# Altium footprint library THU VIEN PCB.PCBLib: 534 footprints (part 18 of 34)
Each footprint in its own frame and in the unit in brackets; x right, y up, seen from the top. Pads: shape width x height; smd on the part's side, far side on the other; paste and mask are expansions set on the pad; w line width, h text height; cw(c..) or ccw(c..) is an arc to the next point about the centre after c.
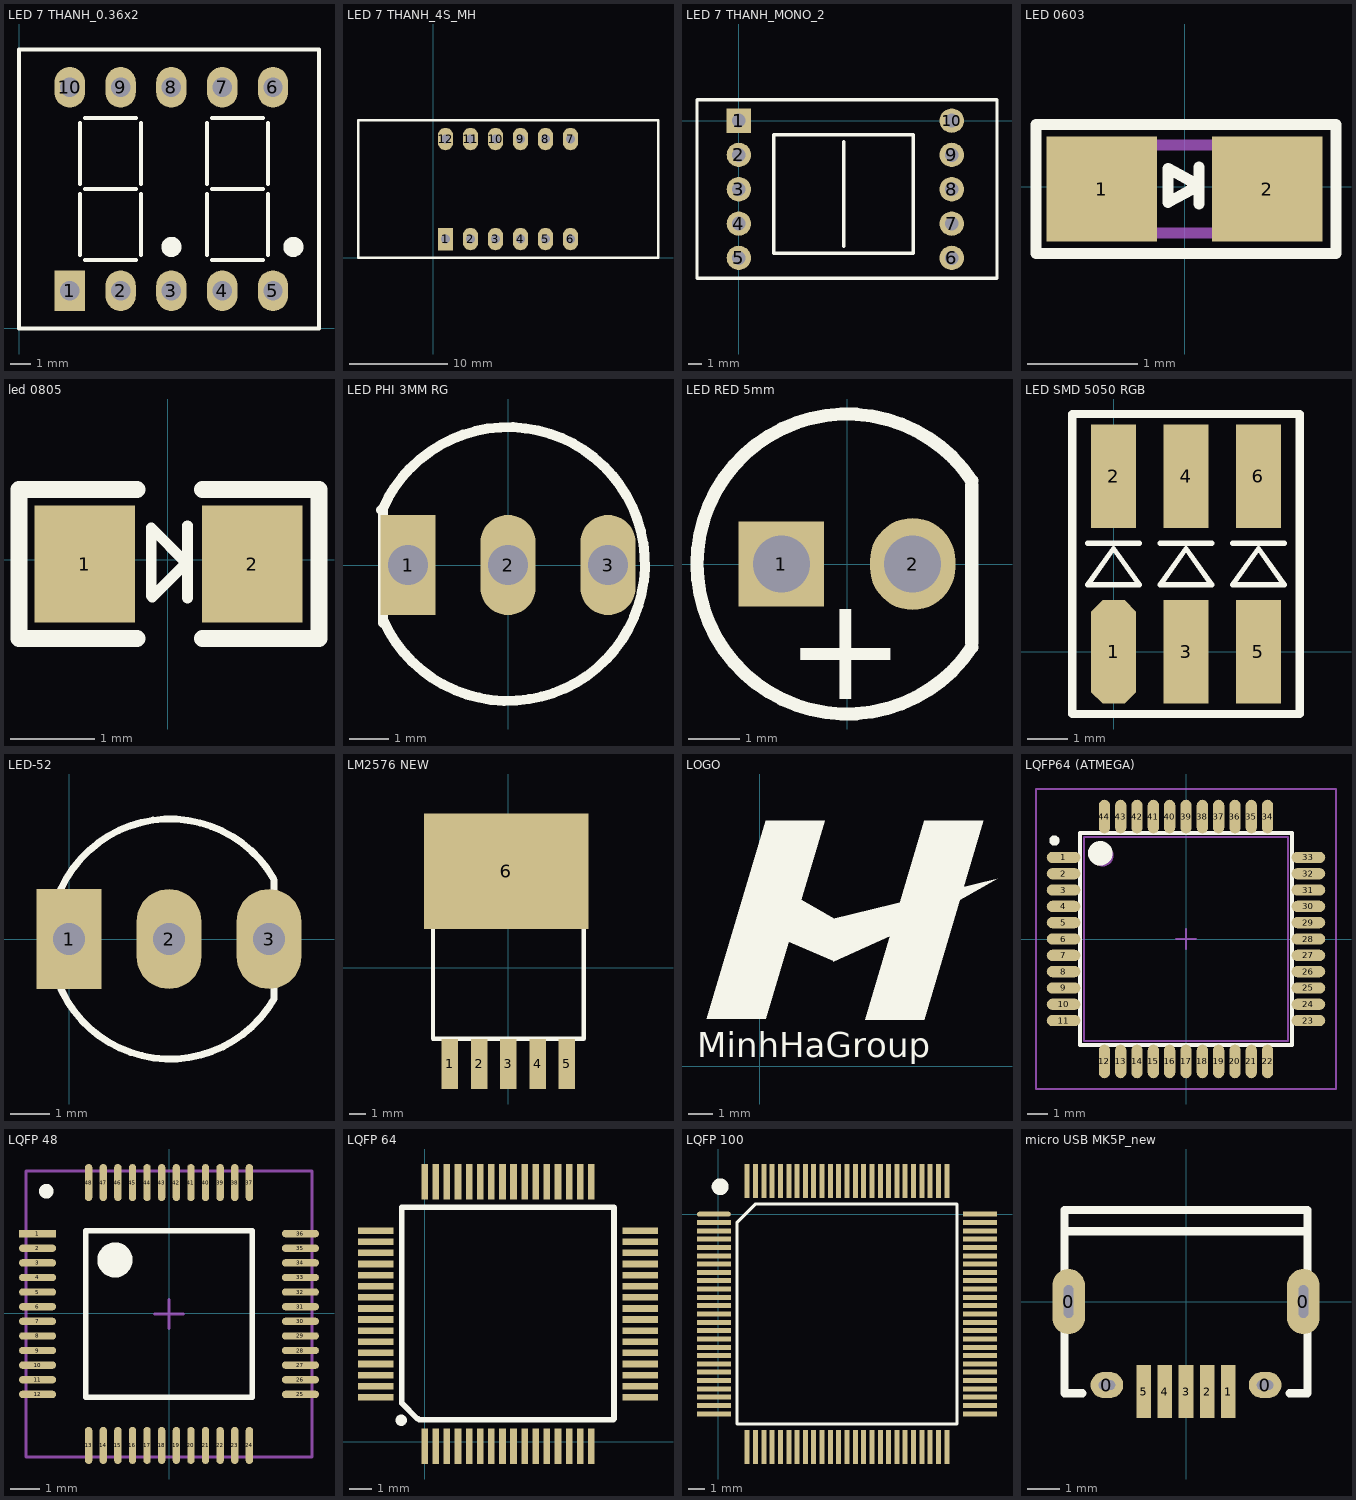
[diagram p17: the footprints below, top view; thin cyan lines are the x and y axes]

## LED 7 THANH_0.36x2 [mil]
pads (10):
  rect 60x80 hole 38: 1(100,74)
  oval 60x80 hole 38: 2(200,74) 3(300,74) 4(400,74) 5(500,74) 6(500,474) 7(400,474) 8(300,474) 9(200,474) 10(100,474)
Top Overlay:
  circle w19.68: c540,160 r10
  circle w19.68: c300,160 r10
  lines w8: 120,144 120,264 ; 120,284 120,404 ; 130,134 230,134 ; 130,274 230,274 ; 130,414 230,414 ; 240,144 240,264 ; 240,284 240,404 ; 370,144 370,264 ; 370,284 370,404 ; 380,134 480,134 ; 380,274 480,274 ; 380,414 480,414 ; 490,144 490,264 ; 490,284 490,404 ; 0,-1 590.55,-1 590.55,549 0,549 0,-1

## LED 7 THANH_4S_MH [mil] "LED7seg4"
pads (12):
  rect 60x90 hole 35: 1(50,75)
  oval 60x90 hole 35: 2(150,75) 3(250,75) 4(350,75) 5(450,75) 6(550,75) 7(550,475) 8(450,475) 9(350,475) 10(250,475) 11(150,475) 12(50,475)
Top Overlay:
  lines w10: -300,0 -300,75 -300,550 -265,550 900,550 900,0 -300,0

## LED 7 THANH_MONO_2 [mm]
pads (10):
  rect 1.778x1.778 hole 1 unplated: 1(0,0)
  round 1.778 hole 1 unplated: 2(0,-2.5) 3(0,-5) 4(0,-7.5) 5(0,-10) 6(15.5,-10) 7(15.5,-7.5) 8(15.5,-5) 9(15.5,-2.5) 10(15.5,0)
Top Overlay:
  lines w0.2: -3.048,-11.484 -3.048,1.016 ; 18.796,-11.484 18.796,1.016
  lines w0.254: -3.048,-11.484 18.796,-11.484 ; -3.048,1.016 -3.048,1.524 18.796,1.524 18.796,1.016 ; 7.62,-9.144 7.62,-8.636 7.62,-1.524 ; 2.54,-9.652 2.54,-1.016 12.7,-1.016 12.7,-9.652 2.54,-9.652

## LED 0603 [mm]
pads (2):
  rect 1x0.95 smd mask+0.076: 1(-0.753,-0.019) 2(0.747,-0.019)
Top Overlay:
  lines w0.102: -0.152,-0.139 0.127,0.014 -0.152,0.166 ; -0.152,-0.127 -0.152,0.152 ; 0.127,-0.152 0.127,0.178 ; -1.349,-0.603 -1.349,0.565 1.369,0.565 1.369,-0.603 -1.349,-0.603
Mechanical 13:
  lines w0.1: -0.803,-0.419 -0.803,0.381 0.797,0.381 0.797,-0.419 -0.803,-0.419
3D body "User Library-LED_0603_B.STEP": height 0.6, standoff 0, extent -0.8,-0.4 0.8,0.4

## led 0805 [mm]
pads (2):
  rect 1.2x1.4 smd: 1(-0.996,-0.051) 2(1.004,-0.051)
Top Overlay:
  lines w0.127: -0.199,0.381 -0.199,-0.432 -0.186,-0.445 0.22,-0.038 -0.186,0.368 ; 0.233,-0.457 0.233,0.406
  lines w0.2: -0.367,-0.94 -1.778,-0.94 -1.778,0.838 -0.367,0.838 ; 0.408,-0.94 1.803,-0.94 1.803,0.838 0.408,0.838
3D body "Led SMD 0805.step": height 1.1, standoff 0, extent -0.98,-0.65 1.04,0.6

## LED PHI 3MM RG [mil]
pads (3):
  rect 55x100 hole 40: 1(-100,0)
  oval 55x100 hole 40: 2(0,0) 3(100,0)
Top Overlay:
  lines w10: -125.65,55.23 cw(c0,1) -124.2,-56.47 ; -125,-58 -125,55 ; -125,55 -127,55 -125,55
3D body "User Library-LED RG.step": height 311.26, standoff -217.48, extent -88.58,-78.74 88.58,78.74

## LED RED 5mm [mil] "LED phi 5mm"
height 649.61
pads (2):
  rect 65x65 hole 43.31: 1(-50,0)
  oval 65x70 hole 43.31: 2(50,0)
Top Overlay:
  lines w10: 95,-63.33 cw(c0,0) 95,63.33 ; 95,-60 95,60
  text "+" at -47,-103 h80
3D body "LED RED 5mm.STEP": height 352.76, standoff -255.3, extent -118.11,-118.11 98.43,118.11

## LED SMD 5050 RGB [mil]
pads (6):
  oct 43.31x100 smd: 1(0,0)
  rect 43.31x100 smd: 2(0,170) 3(70,0) 4(70,170) 5(140,0) 6(140,170)
Top Overlay:
  lines w5: -25,105 25,105 ; 45,105 95,105 ; 115,105 165,105 ; -25,65 25,65 0,100 -25,65 ; 45,65 95,65 70,100 45,65 ; 115,65 165,65 140,100 115,65
  lines w8: -40,-60 -40,230 180,230 180,-60 -40,-60
3D body "LED SMD 5050.step": height 63.49, standoff 0.5, extent -28.43,-20 168.43,188.66

## LED-52 [mil] "LED 3 PIN, 5 ly , Two colour"
height 300
pads (3):
  rect 65x100 hole 32: 1(0,0)
  oval 65x100 hole 32: 2(100,0) 3(200,0)
Top Overlay:
  lines w7: 204.51,60.71 ccw(c101,0) 204.94,-59.97 ; 205,-59 205,59
3D body "User Library-led 5mm 3 pin.step": height 475.59, standoff -154.33, extent -19.81,-115.17 214.17,113.18

## LM2576 NEW [mil]
pads (6):
  rect 39.37x120 smd: 1(-140,-230) 2(-70,-230) 3(0,-230) 4(70,-230) 5(140,-230)
  rect 393.7x275.59 smd: 6(-5,230)
Top Overlay:
  lines w10: -160,170 -160,240 -140,260 140,260 160,240 160,170 ; -180,-170 180,-170 180,170 -180,170 -180,-170
3D body "TO-263-5.STEP": height 180.12, standoff 0.6, extent -200,-241.79 200,309.98

## LOGO [mm]
Top Overlay:
  region: 2.667,10.033 0.254,10.033 0.254,1.956
  region: -2.159,1.956 0.254,1.956 0.254,10.033
  region: 4.318,1.905 6.731,1.905 6.731,10.033
  region: 9.144,10.033 6.731,10.033 6.731,1.905
  region: 1.702,6.807 2.413,6.401 3.048,6.045 3.048,4.293 1.041,5.156 1.448,6.02
  region: 2.997,4.283 5.359,5.35 6.833,6.036 9.703,7.68 2.997,6.029
  text "MinhHaGroup" at -2.565,0.381 h1.02

## LQFP64 (ATMEGA) [mm] "QFP, 44-Leads, Body 10x10mm, Pitch 0.8mm, IPC High Density"
height 2.44
pads (44):
  oval 1.65x0.55 smd: 1(-6,4) 2(-6,3.2) 3(-6,2.4) 4(-6,1.6) 5(-6,0.8) 6(-6,0) 7(-6,-0.8) 8(-6,-1.6) 9(-6,-2.4) 10(-6,-3.2) 11(-6,-4) 23(6,-4) 24(6,-3.2) 25(6,-2.4) 26(6,-1.6) 27(6,-0.8) 28(6,0) 29(6,0.8) 30(6,1.6) 31(6,2.4) 32(6,3.2) 33(6,4)
  oval 0.55x1.65 smd: 12(-4,-6) 13(-3.2,-6) 14(-2.4,-6) 15(-1.6,-6) 16(-0.8,-6) 17(0,-6) 18(0.8,-6) 19(1.6,-6) 20(2.4,-6) 21(3.2,-6) 22(4,-6) 34(4,6) 35(3.2,6) 36(2.4,6) 37(1.6,6) 38(0.8,6) 39(0,6) 40(-0.8,6) 41(-1.6,6) 42(-2.4,6) 43(-3.2,6) 44(-4,6)
Top Overlay:
  circle w0.6: c-4.2,4.2 r0.3
  circle w0.25: c-6.45,4.825 r0.125
  lines w0.2: -5.2,-5.2 5.2,-5.2 5.2,5.2 -5.2,5.2 -5.2,-5.2
Mechanical 13:
  circle w0.1: c-4.1,4.1 r0.5
  lines w0.1: -5,-5 5,-5 5,5 -5,5 -5,-5
Mechanical 15:
  lines w0.1: -0.5,0 0.5,0 ; 0,-0.5 0,0.5 ; -7.35,-7.35 7.35,-7.35 7.35,7.35 -7.35,7.35 -7.35,-7.35
3D body "User Library-TQFP44.step": height 1.07, standoff 0, extent -5.994,-5.994 6.006,6.006

## LQFP 48 [mm]
pads (48):
  rect 1.27x0.25 smd: 1(-4.498,2.725)
  oval 1.27x0.25 smd: 2(-4.498,2.225) 3(-4.498,1.725) 4(-4.498,1.225) 5(-4.498,0.725) 6(-4.498,0.225) 7(-4.498,-0.275) 8(-4.498,-0.775) 9(-4.498,-1.275) 10(-4.498,-1.775) 11(-4.498,-2.275) 12(-4.498,-2.775) 25(4.498,-2.775) 26(4.498,-2.275) 27(4.498,-1.775) 28(4.498,-1.275) 29(4.498,-0.775) 30(4.498,-0.275) 31(4.498,0.225) 32(4.498,0.725) 33(4.498,1.225) 34(4.498,1.725) 35(4.498,2.225) 36(4.498,2.725)
  oval 0.25x1.27 smd: 13(-2.75,-4.524) 14(-2.25,-4.524) 15(-1.75,-4.524) 16(-1.25,-4.524) 17(-0.75,-4.524) 18(-0.25,-4.524) 19(0.25,-4.524) 20(0.75,-4.524) 21(1.25,-4.524) 22(1.75,-4.524) 23(2.25,-4.524) 24(2.75,-4.524) 37(2.75,4.473) 38(2.25,4.473) 39(1.75,4.473) 40(1.25,4.473) 41(0.75,4.473) 42(0.25,4.473) 43(-0.25,4.473) 44(-0.75,4.473) 45(-1.25,4.473) 46(-1.75,4.473) 47(-2.25,4.473) 48(-2.75,4.473)
Top Overlay:
  circle w0.6: c-1.85,1.825 r0.3
  circle w0.25: c-4.2,4.175 r0.125
  lines w0.2: -2.85,-2.875 2.85,-2.875 2.85,2.825 -2.85,2.825 -2.85,-2.875
Mechanical 15:
  lines w0.1: -0.5,-0.025 0.5,-0.025 ; 0,-0.525 0,0.475 ; -4.9,-4.925 4.9,-4.925 4.9,4.875 -4.9,4.875 -4.9,-4.925
3D body "SW3dPS-LQFP48.STEP": height 1.5, standoff 0, extent -4.5,-4.525 4.5,4.475

## LQFP 64 [mm]
pads (64):
  rect 0.3x1.6 smd: 1(0,-0.2) 2(0.5,-0.2) 3(1,-0.2) 4(1.5,-0.2) 5(2,-0.2) 6(2.5,-0.2) 7(3,-0.2) 8(3.5,-0.2) 9(4,-0.2) 10(4.5,-0.2) 11(5,-0.2) 12(5.5,-0.2) 13(6,-0.2) 14(6.5,-0.2) 15(7,-0.2) 16(7.5,-0.2) 33(7.5,11.7) 34(7,11.7) 35(6.5,11.7) 36(6,11.7) 37(5.5,11.7) 38(5,11.7) 39(4.5,11.7) 40(4,11.7) 41(3.5,11.7) 42(3,11.7) 43(2.5,11.7) 44(2,11.7) 45(1.5,11.7) 46(1,11.7) 47(0.5,11.7) 48(0,11.7)
  rect 1.6x0.3 smd: 17(9.7,2) 18(9.7,2.5) 19(9.7,3) 20(9.7,3.5) 21(9.7,4) 22(9.7,4.5) 23(9.7,5) 24(9.7,5.5) 25(9.7,6) 26(9.7,6.5) 27(9.7,7) 28(9.7,7.5) 29(9.7,8) 30(9.7,8.5) 31(9.7,9) 32(9.7,9.5) 49(-2.2,9.5) 50(-2.2,9) 51(-2.2,8.5) 52(-2.2,8) 53(-2.2,7.5) 54(-2.2,7) 55(-2.2,6.5) 56(-2.2,6) 57(-2.2,5.5) 58(-2.2,5) 59(-2.2,4.5) 60(-2.2,4) 61(-2.2,3.5) 62(-2.2,3) 63(-2.2,2.5) 64(-2.2,2)
Top Overlay:
  lines w0.254: -1.029,10.389 -1.029,10.554 8.42,10.554 8.509,10.554 8.522,10.541 8.522,1.029 8.484,0.991 -0.241,0.991 ; -1.029,10.528 -1.029,1.74 -0.318,1.029 -0.292,1.029
  lines w0.508: -1.067,0.965 -1.054,0.965
3D body "User Library-LQFP64_Grid_0_5.STEP": height 2.32, standoff -0.01, extent -2.352,-0.234 9.723,11.766

## LQFP 100 [mm]
pads (100):
  oval 2.032x0.3 smd: 1(-0.25,0)
  rect 2.032x0.3 smd: 2(-0.25,-0.5) 3(-0.25,-1) 4(-0.25,-1.5) 5(-0.25,-2) 6(-0.25,-2.5) 7(-0.25,-3) 8(-0.25,-3.5) 9(-0.25,-4) 10(-0.25,-4.5) 11(-0.25,-5) 12(-0.25,-5.5) 13(-0.25,-6) 14(-0.25,-6.5) 15(-0.25,-7) 16(-0.25,-7.5) 17(-0.25,-8) 18(-0.25,-8.5) 19(-0.25,-9) 20(-0.25,-9.5) 21(-0.25,-10) 22(-0.25,-10.5) 23(-0.25,-11) 24(-0.25,-11.5) 25(-0.25,-12) 51(15.75,-12) 52(15.75,-11.5) 53(15.75,-11) 54(15.75,-10.5) 55(15.75,-10) 56(15.75,-9.5) 57(15.75,-9) 58(15.75,-8.5) 59(15.75,-8) 60(15.75,-7.5) 61(15.75,-7) 62(15.75,-6.5) 63(15.75,-6) 64(15.75,-5.5) 65(15.75,-5) 66(15.75,-4.5) 67(15.75,-4) 68(15.75,-3.5) 69(15.75,-3) 70(15.75,-2.5) 71(15.75,-2) 72(15.75,-1.5) 73(15.75,-1) 74(15.75,-0.5) 75(15.75,0)
  rect 0.3x2.032 smd: 26(1.75,-14) 27(2.25,-14) 28(2.75,-14) 29(3.25,-14) 30(3.75,-14) 31(4.25,-14) 32(4.75,-14) 33(5.25,-14) 34(5.75,-14) 35(6.25,-14) 36(6.75,-14) 37(7.25,-14) 38(7.75,-14) 39(8.25,-14) 40(8.75,-14) 41(9.25,-14) 42(9.75,-14) 43(10.25,-14) 44(10.75,-14) 45(11.25,-14) 46(11.75,-14) 47(12.25,-14) 48(12.75,-14) 49(13.25,-14) 50(13.75,-14) 76(13.75,2) 77(13.25,2) 78(12.75,2) 79(12.25,2) 80(11.75,2) 81(11.25,2) 82(10.75,2) 83(10.25,2) 84(9.75,2) 85(9.25,2) 86(8.75,2) 87(8.25,2) 88(7.75,2) 89(7.25,2) 90(6.75,2) 91(6.25,2) 92(5.75,2) 93(5.25,2) 94(4.75,2) 95(4.25,2) 96(3.75,2) 97(3.25,2) 98(2.75,2) 99(2.25,2) 100(1.75,2)
Top Overlay:
  circle w0.508: c0.127,1.651 r0.254
  lines w0.2: 1.135,-12.615 14.365,-12.615 14.365,0.615 2.27,0.615 1.135,-0.52 1.135,-12.615
3D body "SW3dPS-LQFP100.STEP": height 1.6, standoff 0, extent -0.228,-13.994 15.772,2.006

## micro USB MK5P_new [mm]
pads (9):
  oval 1x2 hole 1 slot 0.3 at 0 deg: 0(-3.6,0) 0(3.6,0)
  oval 1x0.8 hole 0.3 slot 0.5 at 0 deg: 0(-2.425,-2.56) 0(2.425,-2.56)
  rect 0.45x1.622 smd: 1(1.3,-2.76)
  rect 0.45x1.62 smd: 2(0.65,-2.76) 3(0,-2.76) 4(-0.65,-2.76) 5(-1.3,-2.76)
Top Overlay:
  lines w0.254: -3.725,-2.81 -3.725,2.81 3.725,2.81 3.725,-2.81 ; -3.725,2.16 3.725,2.16 ; -3.683,-2.81 -3.175,-2.81 ; 3.175,-2.81 3.683,-2.81
3D body "User Library-MicroUSB-B_Molex_105017-0001.step": height 2.71, standoff -0.59, extent -4.1,-2.65 4.1,2.78